# Altium footprint library 我的封装库.PcbLib: 90 footprints (part 3 of 6)
Each footprint in its own frame and in the unit in brackets; x right, y up, seen from the top. Pads: shape width x height; smd on the part's side, far side on the other; paste and mask are expansions set on the pad; w line width, h text height; cw(c..) or ccw(c..) is an arc to the next point about the centre after c.
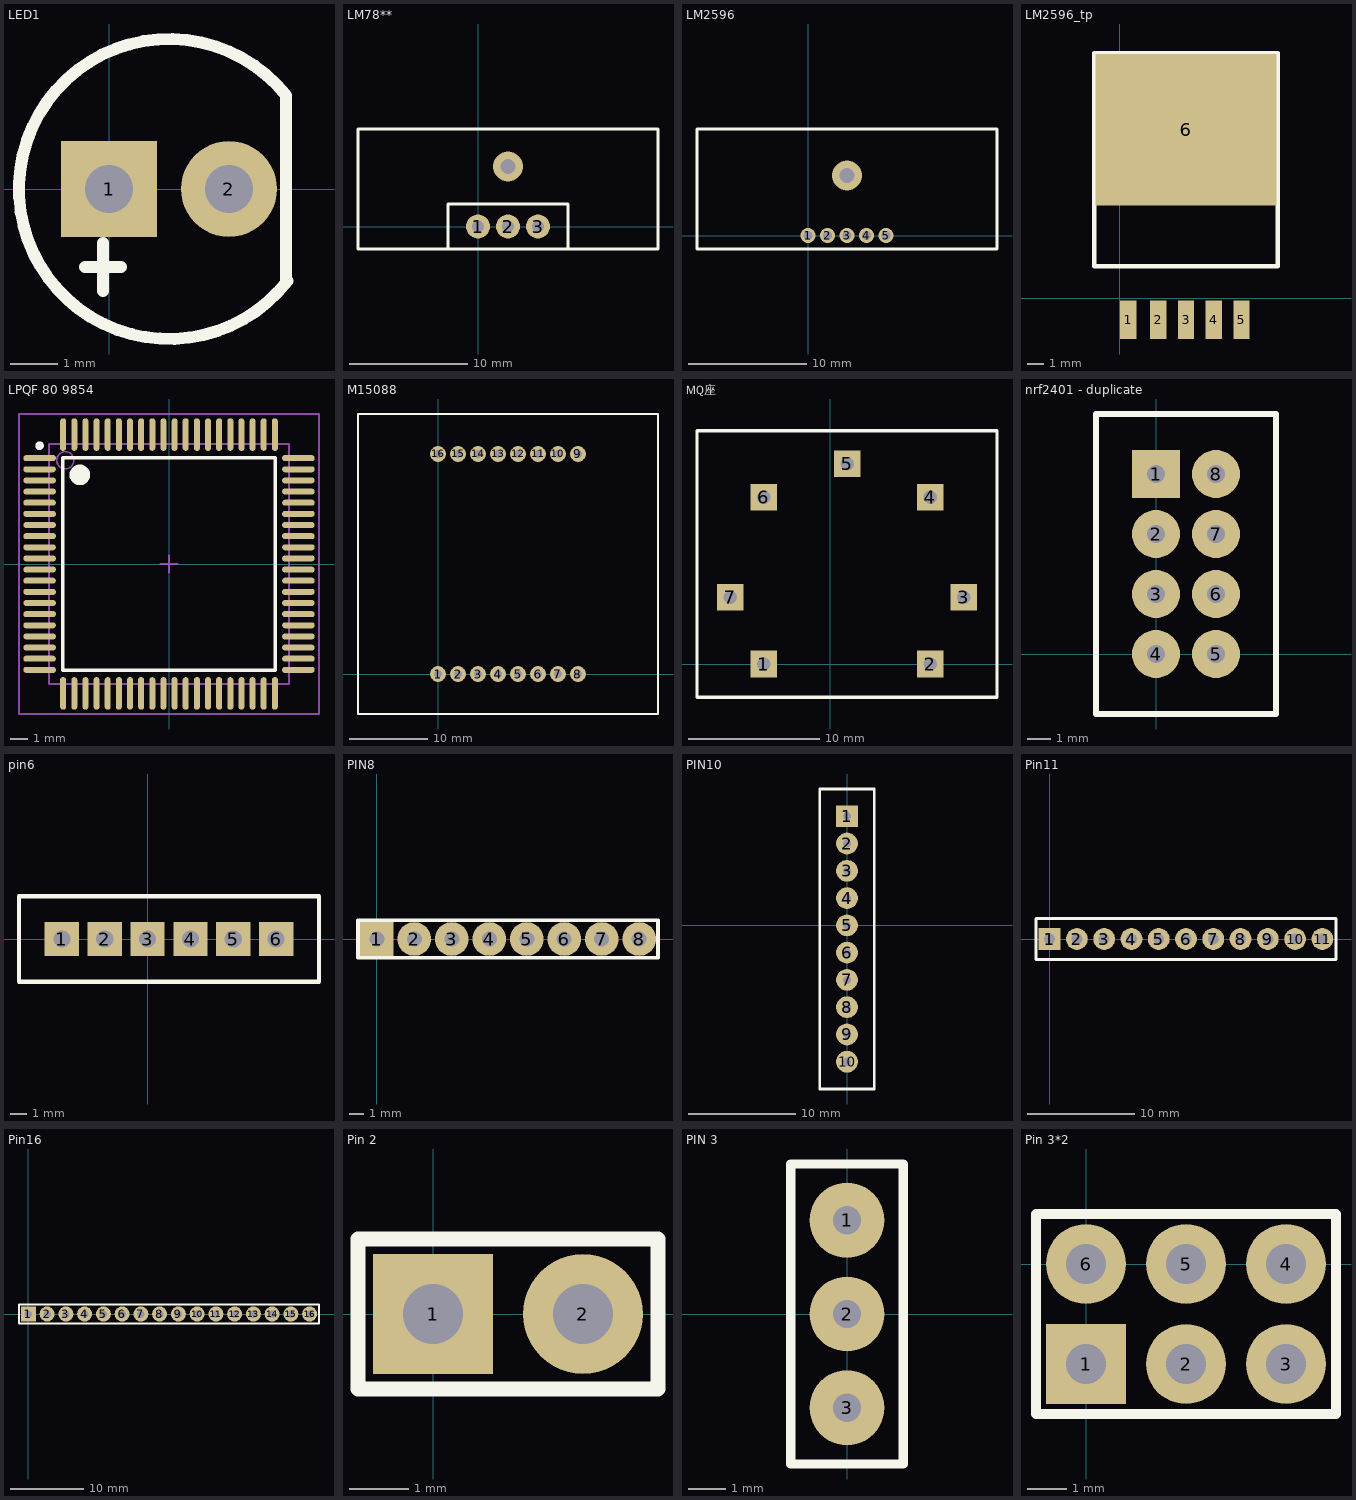
[diagram p2: the footprints below, top view; thin cyan lines are the x and y axes]

## LED1 [mil]
pads (2):
  rect 80x80 hole 40: 1(0,0)
  round 80 hole 40: 2(100,0)
Top Overlay:
  lines w10: -20,-65 10,-65 ; -5,-85 -5,-45 ; 147.61,-76.74 147.61,78.09 ccw(c50,0) 148.67,-76.74

## LM78** [mil]
pads (4):
  round 80 hole 40: 1(0,0) 2(100,0) 3(200,0)
  round 100 hole 50: ""(100,200)
Top Overlay:
  lines w10: -400,-75 -400,325 600,325 600,-75 -400,-75 ; -100,-75 -100,75 300,75 300,-75 -100,-75

## LM2596 [mil]
pads (6):
  round 50 hole 30: 1(0,0) 2(65,0) 3(130,0) 4(195,0) 5(260,0)
  round 100 hole 50: ""(130,200)
Top Overlay:
  lines w10: -370,-45 630,-45 630,355 -370,355 -370,-45

## LM2596_tp [mm]
pads (6):
  rect 0.97x2.3 smd: 1(0.508,-1.27) 2(2.286,-1.27) 3(3.937,-1.27) 4(5.588,-1.27) 5(7.239,-1.27)
  rect 10.8x9 smd: 6(3.937,10.033)
Top Overlay:
  lines w0.254: -1.524,1.905 -1.524,14.605 9.398,14.605 9.398,1.905 -1.524,1.905

## LPQF 80 9854 [mm]
pads (80):
  oval 1.9x0.35 smd: 1(-7.55,6.175) 2(-7.55,5.525) 3(-7.55,4.875) 4(-7.55,4.225) 5(-7.55,3.575) 6(-7.55,2.925) 7(-7.55,2.275) 8(-7.55,1.625) 9(-7.55,0.975) 10(-7.55,0.325) 11(-7.55,-0.325) 12(-7.55,-0.975) 13(-7.55,-1.625) 14(-7.55,-2.275) 15(-7.55,-2.925) 16(-7.55,-3.575) 17(-7.55,-4.225) 18(-7.55,-4.875) 19(-7.55,-5.525) 20(-7.55,-6.175) 41(7.55,-6.175) 42(7.55,-5.525) 43(7.55,-4.875) 44(7.55,-4.225) 45(7.55,-3.575) 46(7.55,-2.925) 47(7.55,-2.275) 48(7.55,-1.625) 49(7.55,-0.975) 50(7.55,-0.325) 51(7.55,0.325) 52(7.55,0.975) 53(7.55,1.625) 54(7.55,2.275) 55(7.55,2.925) 56(7.55,3.575) 57(7.55,4.225) 58(7.55,4.875) 59(7.55,5.525) 60(7.55,6.175)
  oval 0.35x1.9 smd: 21(-6.175,-7.55) 22(-5.525,-7.55) 23(-4.875,-7.55) 24(-4.225,-7.55) 25(-3.575,-7.55) 26(-2.925,-7.55) 27(-2.275,-7.55) 28(-1.625,-7.55) 29(-0.975,-7.55) 30(-0.325,-7.55) 31(0.325,-7.55) 32(0.975,-7.55) 33(1.625,-7.55) 34(2.275,-7.55) 35(2.925,-7.55) 36(3.575,-7.55) 37(4.225,-7.55) 38(4.875,-7.55) 39(5.525,-7.55) 40(6.175,-7.55) 61(6.175,7.55) 62(5.525,7.55) 63(4.875,7.55) 64(4.225,7.55) 65(3.575,7.55) 66(2.925,7.55) 67(2.275,7.55) 68(1.625,7.55) 69(0.975,7.55) 70(0.325,7.55) 71(-0.325,7.55) 72(-0.975,7.55) 73(-1.625,7.55) 74(-2.275,7.55) 75(-2.925,7.55) 76(-3.575,7.55) 77(-4.225,7.55) 78(-4.875,7.55) 79(-5.525,7.55) 80(-6.175,7.55)
Top Overlay:
  circle w0.6: c-5.2,5.2 r0.3
  circle w0.25: c-7.55,6.9 r0.125
  lines w0.2: -6.2,-6.2 6.2,-6.2 6.2,6.2 -6.2,6.2 -6.2,-6.2
Mechanical 13:
  circle w0.1: c-6.05,6.05 r0.5
  lines w0.1: -7,-7 7,-7 7,7 -7,7 -7,-7
Mechanical 15:
  lines w0.1: -0.5,0 0.5,0 ; 0,-0.5 0,0.5 ; -8.75,-8.75 8.75,-8.75 8.75,8.75 -8.75,8.75 -8.75,-8.75
3D body: height 1.05, standoff 0.05, extent -7,-7 7,7

## M15088 [mil]
pads (16):
  round 80 hole 40: 1(0,0) 2(100,0) 3(200,0) 4(300,0) 5(400,0) 6(500,0) 7(600,0) 8(700,0) 9(700,1100) 10(600,1100) 11(500,1100) 12(400,1100) 13(300,1100) 14(200,1100) 15(100,1100) 16(0,1100)
Top Overlay:
  lines w10: -400,-200 0,-200 950,-200 1100,-200 1100,0 1100,1300 850,1300 -200,1300 -400,1300 -400,-200

## MQ座 [mil]
pads (7):
  rect 80x80 hole 40: 1(-200,0) 2(300,0) 3(400,200) 4(300,500) 5(51.22,600.67) 6(-200,500) 7(-300,200)
Top Overlay:
  lines w10: -400,-100 500,-100 500,700 -400,700 -400,-100

## nrf2401 - duplicate [mil]
pads (8):
  rect 80x80 hole 30: 1(0,300)
  round 80 hole 30: 2(0,200) 3(0,100) 4(0,0) 5(100,0) 6(100,100) 7(100,200) 8(100,300)
Top Overlay:
  lines w10: -100,-100 200,-100 200,400 -100,400 -100,-100

## pin6 [mil]
pads (6):
  rect 80x80 hole 40: 1(-200,0) 2(-100,0) 3(0,0) 4(100,0) 5(200,0) 6(300,0)
Top Overlay:
  lines w10: -300,-100 400,-100 400,100 -300,100 -300,-100

## PIN8 [mil]
pads (8):
  rect 90x90 hole 40: 1(0,0)
  round 90 hole 40: 2(100,0) 3(200,0) 4(300,0) 5(400,0) 6(500,0) 7(600,0) 8(700,0)
Top Overlay:
  lines w10: -50,-50 750,-50 750,50 -50,50 -50,-50

## PIN10 [mil]
pads (10):
  rect 80x80 hole 30: 1(0,400)
  round 80 hole 30: 2(0,300) 3(0,200) 4(0,100) 5(0,0) 6(0,-100) 7(0,-200) 8(0,-300) 9(0,-400) 10(0,-500)
Top Overlay:
  lines w10: -100,-600 100,-600 100,500 -100,500 -100,-600

## Pin11 [mil]
pads (11):
  rect 80x80 hole 40: 1(0,0)
  round 80 hole 40: 2(100,0) 3(200,0) 4(300,0) 5(400,0) 6(500,0) 7(600,0) 8(700,0) 9(800,0) 10(900,0) 11(1000,0)
Top Overlay:
  lines w10: -50,-75 -50,75 1050,75 1050,50 1050,-75 -50,-75

## Pin16 [mil]
pads (16):
  rect 80x80 hole 40: 1(0,0)
  round 80 hole 40: 2(100,0) 3(200,0) 4(300,0) 5(400,0) 6(500,0) 7(600,0) 8(700,0) 9(800,0) 10(900,0) 11(1000,0) 12(1100,0) 13(1200,0) 14(1300,0) 15(1400,0) 16(1500,0)
Top Overlay:
  lines w10: -50,-50 -50,50 1550,50 1550,-50 -50,-50

## Pin 2 [mil]
pads (2):
  rect 80x80 hole 40: 1(0,0)
  round 80 hole 40: 2(100,0)
Top Overlay:
  lines w10: -50,-50 -50,50 150,50 150,-50 -50,-50

## PIN 3 [mil]
pads (3):
  round 80 hole 30: 1(0,100) 2(0,0) 3(0,-100)
Top Overlay:
  lines w10: -60,-160 60,-160 60,160 -60,160 -60,-160

## Pin 3*2 [mil]
pads (6):
  rect 80x80 hole 40: 1(0,-100)
  round 80 hole 40: 2(100,-100) 3(200,-100) 4(200,0) 5(100,0) 6(0,0)
Top Overlay:
  lines w10: -50,-150 250,-150 250,50 -50,50 -50,-150